# Altium footprint library Resistors_SMD_IPC-SM-782.PcbLib: 200 footprints (part 4 of 13)
Each footprint in its own frame and in the unit in brackets; x right, y up, seen from the top. Pads: shape width x height; smd on the part's side, far side on the other; paste and mask are expansions set on the pad; w line width, h text height; cw(c..) or ccw(c..) is an arc to the next point about the centre after c.
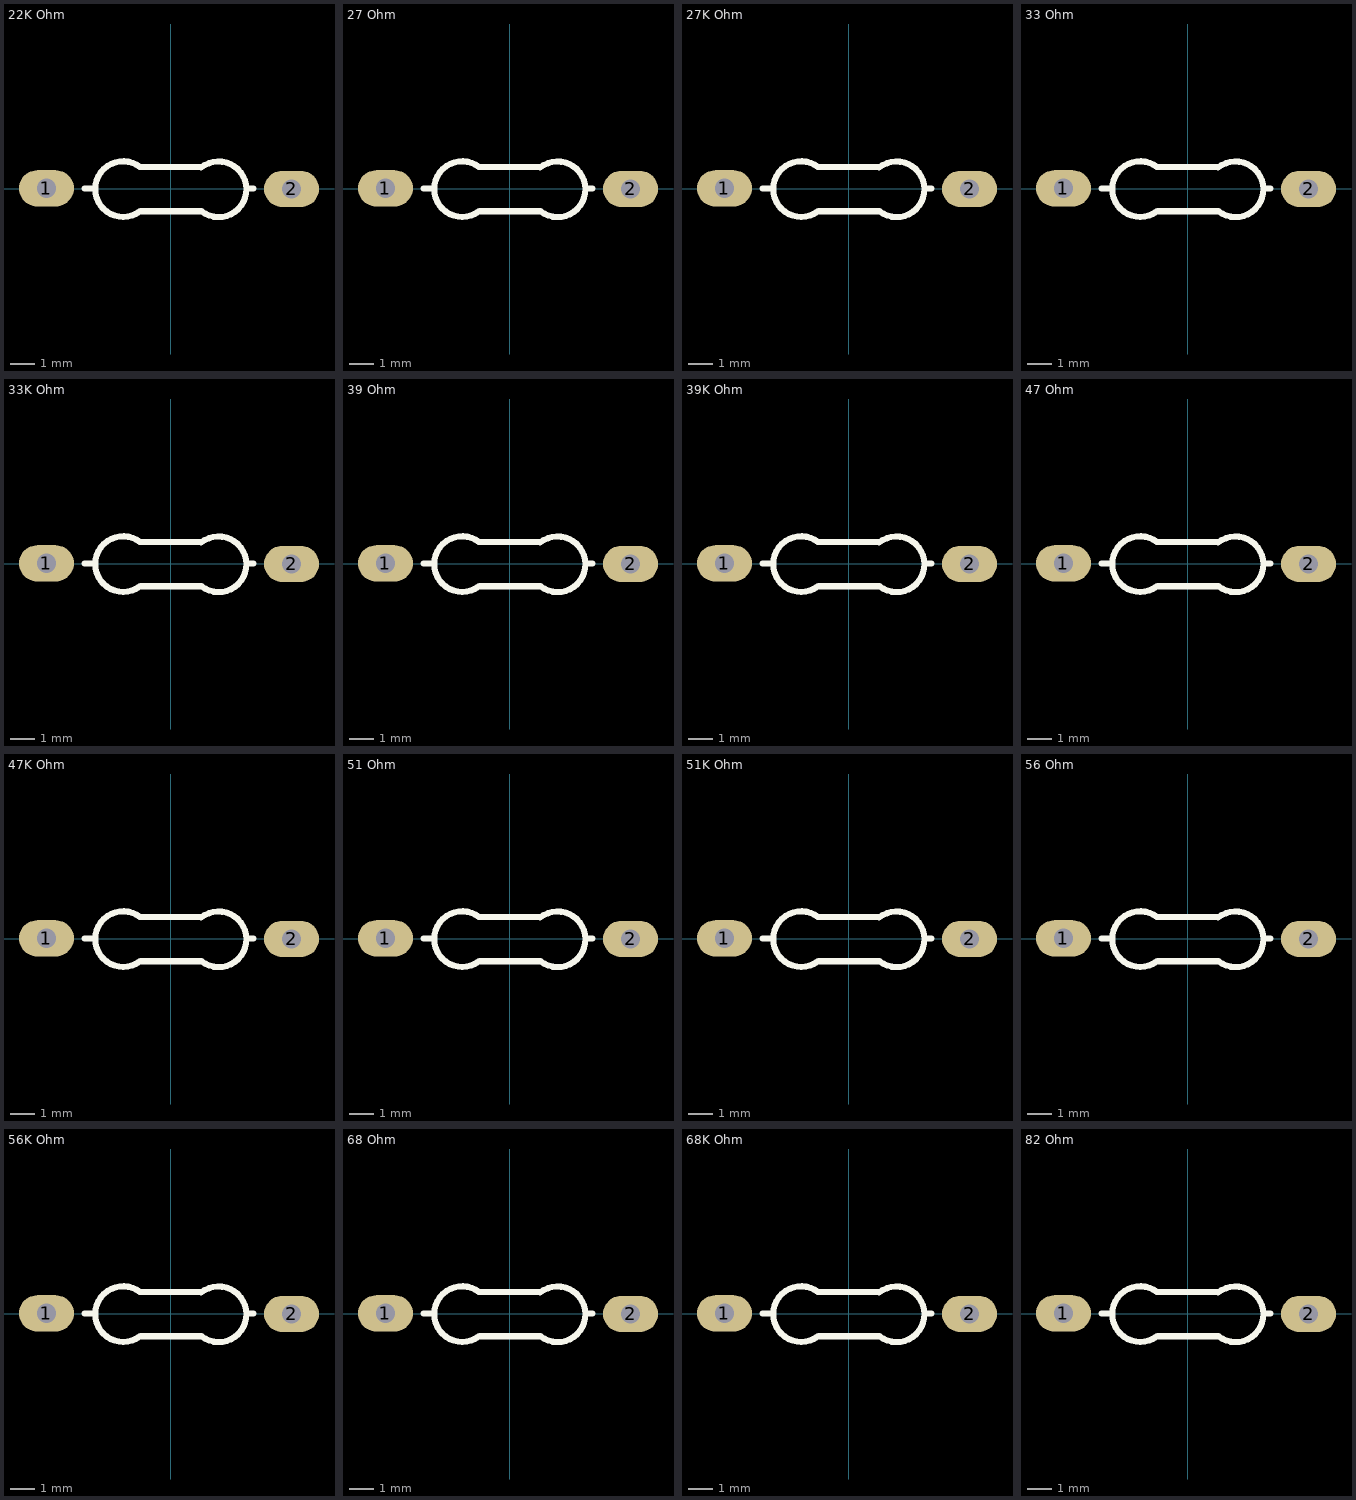
[diagram p3: the footprints below, top view; thin cyan lines are the x and y axes]

## 22K Ohm [mm] "RESISTENCIA DE 1/4 W DE 22K OHM"
pads (2):
  oval 2.27x1.5 hole 0.8: 1(-5.125,0.025) 2(5,0)
Top Overlay:
  lines w0.254: -3.55,0.025 -3.225,0.025 ; -1.269,-0.925 cw(c-1.959,-0.005) -1.25,0.9 ; -1.248,0.9 1.25,0.9 ; -1.245,-0.925 1.286,-0.925 ; 1.265,0.881 cw(c1.985,-0.015) 1.286,-0.928 ; 3.15,0.025 3.425,0.025
3D body "Res 22K.STEP": height 2.93, standoff -0.91, extent -5.385,-1.168 5.385,1.143
3D body "SW3dPS-RESISTOR, 0.25 W, 0.4 IN LEAD PITCH.STEP": height 1.16, standoff -1.16, extent -5.56,-2.349 5.21,3.125

## 27 Ohm [mm] "RESISTENCIA DE 1/4 W DE 27 OHM"
pads (2):
  oval 2.27x1.5 hole 0.8: 1(-5.125,0.025) 2(5,0)
Top Overlay:
  lines w0.254: -3.55,0.025 -3.225,0.025 ; -1.269,-0.925 cw(c-1.959,-0.005) -1.25,0.9 ; -1.248,0.9 1.25,0.9 ; -1.245,-0.925 1.286,-0.925 ; 1.265,0.881 cw(c1.985,-0.015) 1.286,-0.928 ; 3.15,0.025 3.425,0.025
3D body "Res 27.STEP": height 2.93, standoff -0.91, extent -5.385,-1.168 5.385,1.143
3D body "SW3dPS-RESISTOR, 0.25 W, 0.4 IN LEAD PITCH.STEP": height 1.16, standoff -1.16, extent -5.56,-2.349 5.21,3.125

## 27K Ohm [mm] "RESISTENCIA DE 1/4 W DE 27K OHM"
pads (2):
  oval 2.27x1.5 hole 0.8: 1(-5.125,0.025) 2(5,0)
Top Overlay:
  lines w0.254: -3.55,0.025 -3.225,0.025 ; -1.269,-0.925 cw(c-1.959,-0.005) -1.25,0.9 ; -1.248,0.9 1.25,0.9 ; -1.245,-0.925 1.286,-0.925 ; 1.265,0.881 cw(c1.985,-0.015) 1.286,-0.928 ; 3.15,0.025 3.425,0.025
3D body "Res 27K.STEP": height 2.93, standoff -0.91, extent -5.385,-1.168 5.385,1.143
3D body "SW3dPS-RESISTOR, 0.25 W, 0.4 IN LEAD PITCH.STEP": height 1.16, standoff -1.16, extent -5.56,-2.349 5.21,3.125

## 33 Ohm [mm] "RESISTENCIA DE 1/4 W DE 33 OHM"
pads (2):
  oval 2.27x1.5 hole 0.8: 1(-5.125,0.025) 2(5,0)
Top Overlay:
  lines w0.254: -3.55,0.025 -3.225,0.025 ; -1.269,-0.925 cw(c-1.959,-0.005) -1.25,0.9 ; -1.248,0.9 1.25,0.9 ; -1.245,-0.925 1.286,-0.925 ; 1.265,0.881 cw(c1.985,-0.015) 1.286,-0.928 ; 3.15,0.025 3.425,0.025
3D body "SW3dPS-RESISTOR, 0.25 W, 0.4 IN LEAD PITCH.STEP": height 1.16, standoff -1.16, extent -5.56,-2.349 5.21,3.125
3D body "Res 33.STEP": height 2.93, standoff -0.91, extent -5.385,-1.168 5.385,1.143

## 33K Ohm [mm] "RESISTENCIA DE 1/4 W DE 33K OHM"
pads (2):
  oval 2.27x1.5 hole 0.8: 1(-5.125,0.025) 2(5,0)
Top Overlay:
  lines w0.254: -3.55,0.025 -3.225,0.025 ; -1.269,-0.925 cw(c-1.959,-0.005) -1.25,0.9 ; -1.248,0.9 1.25,0.9 ; -1.245,-0.925 1.286,-0.925 ; 1.265,0.881 cw(c1.985,-0.015) 1.286,-0.928 ; 3.15,0.025 3.425,0.025
3D body "Res 33K.STEP": height 2.93, standoff -0.91, extent -5.385,-1.168 5.385,1.143
3D body "SW3dPS-RESISTOR, 0.25 W, 0.4 IN LEAD PITCH.STEP": height 1.16, standoff -1.16, extent -5.56,-2.349 5.21,3.125

## 39 Ohm [mm] "RESISTENCIA DE 1/4 W DE 39 OHM"
pads (2):
  oval 2.27x1.5 hole 0.8: 1(-5.125,0.025) 2(5,0)
Top Overlay:
  lines w0.254: -3.55,0.025 -3.225,0.025 ; -1.269,-0.925 cw(c-1.959,-0.005) -1.25,0.9 ; -1.248,0.9 1.25,0.9 ; -1.245,-0.925 1.286,-0.925 ; 1.265,0.881 cw(c1.985,-0.015) 1.286,-0.928 ; 3.15,0.025 3.425,0.025
3D body "Res 39.STEP": height 2.93, standoff -0.91, extent -5.385,-1.168 5.385,1.143
3D body "SW3dPS-RESISTOR, 0.25 W, 0.4 IN LEAD PITCH.STEP": height 1.16, standoff -1.16, extent -5.56,-2.349 5.21,3.125

## 39K Ohm [mm] "RESISTENCIA DE 1/4 W DE 39K OHM"
pads (2):
  oval 2.27x1.5 hole 0.8: 1(-5.125,0.025) 2(5,0)
Top Overlay:
  lines w0.254: -3.55,0.025 -3.225,0.025 ; -1.269,-0.925 cw(c-1.959,-0.005) -1.25,0.9 ; -1.248,0.9 1.25,0.9 ; -1.245,-0.925 1.286,-0.925 ; 1.265,0.881 cw(c1.985,-0.015) 1.286,-0.928 ; 3.15,0.025 3.425,0.025
3D body "Res 39K.STEP": height 2.93, standoff -0.91, extent -5.385,-1.168 5.385,1.143
3D body "SW3dPS-RESISTOR, 0.25 W, 0.4 IN LEAD PITCH.STEP": height 1.16, standoff -1.16, extent -5.56,-2.349 5.21,3.125

## 47 Ohm [mm] "RESISTENCIA DE 1/4 W DE 47 OHM"
pads (2):
  oval 2.27x1.5 hole 0.8: 1(-5.125,0.025) 2(5,0)
Top Overlay:
  lines w0.254: -3.55,0.025 -3.225,0.025 ; -1.269,-0.925 cw(c-1.959,-0.005) -1.25,0.9 ; -1.248,0.9 1.25,0.9 ; -1.245,-0.925 1.286,-0.925 ; 1.265,0.881 cw(c1.985,-0.015) 1.286,-0.928 ; 3.15,0.025 3.425,0.025
3D body "Res 47.STEP": height 2.93, standoff -0.91, extent -5.385,-1.168 5.385,1.143
3D body "SW3dPS-RESISTOR, 0.25 W, 0.4 IN LEAD PITCH.STEP": height 1.16, standoff -1.16, extent -5.56,-2.349 5.21,3.125

## 47K Ohm [mm] "RESISTENCIA DE 1/4 W DE 47K OHM"
pads (2):
  oval 2.27x1.5 hole 0.8: 1(-5.125,0.025) 2(5,0)
Top Overlay:
  lines w0.254: -3.55,0.025 -3.225,0.025 ; -1.269,-0.925 cw(c-1.959,-0.005) -1.25,0.9 ; -1.248,0.9 1.25,0.9 ; -1.245,-0.925 1.286,-0.925 ; 1.265,0.881 cw(c1.985,-0.015) 1.286,-0.928 ; 3.15,0.025 3.425,0.025
3D body "Res 47K.STEP": height 2.93, standoff -0.91, extent -5.385,-1.168 5.385,1.143
3D body "SW3dPS-RESISTOR, 0.25 W, 0.4 IN LEAD PITCH.STEP": height 1.16, standoff -1.16, extent -5.56,-2.349 5.21,3.125

## 51 Ohm [mm] "RESISTENCIA DE 1/4 W DE 51 OHM"
pads (2):
  oval 2.27x1.5 hole 0.8: 1(-5.125,0.025) 2(5,0)
Top Overlay:
  lines w0.254: -3.55,0.025 -3.225,0.025 ; -1.269,-0.925 cw(c-1.959,-0.005) -1.25,0.9 ; -1.248,0.9 1.25,0.9 ; -1.245,-0.925 1.286,-0.925 ; 1.265,0.881 cw(c1.985,-0.015) 1.286,-0.928 ; 3.15,0.025 3.425,0.025
3D body "Res 51.STEP": height 2.93, standoff -0.91, extent -5.385,-1.168 5.385,1.143
3D body "SW3dPS-RESISTOR, 0.25 W, 0.4 IN LEAD PITCH.STEP": height 1.16, standoff -1.16, extent -5.56,-2.349 5.21,3.125

## 51K Ohm [mm] "RESISTENCIA DE 1/4 W DE 51K OHM"
pads (2):
  oval 2.27x1.5 hole 0.8: 1(-5.125,0.025) 2(5,0)
Top Overlay:
  lines w0.254: -3.55,0.025 -3.225,0.025 ; -1.269,-0.925 cw(c-1.959,-0.005) -1.25,0.9 ; -1.248,0.9 1.25,0.9 ; -1.245,-0.925 1.286,-0.925 ; 1.265,0.881 cw(c1.985,-0.015) 1.286,-0.928 ; 3.15,0.025 3.425,0.025
3D body "Res 51K.STEP": height 2.93, standoff -0.91, extent -5.385,-1.168 5.385,1.143
3D body "SW3dPS-RESISTOR, 0.25 W, 0.4 IN LEAD PITCH.STEP": height 1.16, standoff -1.16, extent -5.56,-2.349 5.21,3.125

## 56 Ohm [mm] "RESISTENCIA DE 1/4 W DE 56 OHM"
pads (2):
  oval 2.27x1.5 hole 0.8: 1(-5.125,0.025) 2(5,0)
Top Overlay:
  lines w0.254: -3.55,0.025 -3.225,0.025 ; -1.269,-0.925 cw(c-1.959,-0.005) -1.25,0.9 ; -1.248,0.9 1.25,0.9 ; -1.245,-0.925 1.286,-0.925 ; 1.265,0.881 cw(c1.985,-0.015) 1.286,-0.928 ; 3.15,0.025 3.425,0.025
3D body "SW3dPS-RESISTOR, 0.25 W, 0.4 IN LEAD PITCH.STEP": height 1.16, standoff -1.16, extent -5.56,-2.349 5.21,3.125
3D body "Res 56.STEP": height 2.93, standoff -0.91, extent -5.385,-1.168 5.385,1.143

## 56K Ohm [mm] "RESISTENCIA DE 1/4 W DE 56K OHM"
pads (2):
  oval 2.27x1.5 hole 0.8: 1(-5.125,0.025) 2(5,0)
Top Overlay:
  lines w0.254: -3.55,0.025 -3.225,0.025 ; -1.269,-0.925 cw(c-1.959,-0.005) -1.25,0.9 ; -1.248,0.9 1.25,0.9 ; -1.245,-0.925 1.286,-0.925 ; 1.265,0.881 cw(c1.985,-0.015) 1.286,-0.928 ; 3.15,0.025 3.425,0.025
3D body "SW3dPS-RESISTOR, 0.25 W, 0.4 IN LEAD PITCH.STEP": height 1.16, standoff -1.16, extent -5.56,-2.349 5.21,3.125
3D body "Res 56K.STEP": height 2.93, standoff -0.91, extent -5.385,-1.168 5.385,1.143

## 68 Ohm [mm] "RESISTENCIA DE 1/4 W DE 68 OHM"
pads (2):
  oval 2.27x1.5 hole 0.8: 1(-5.125,0.025) 2(5,0)
Top Overlay:
  lines w0.254: -3.55,0.025 -3.225,0.025 ; -1.269,-0.925 cw(c-1.959,-0.005) -1.25,0.9 ; -1.248,0.9 1.25,0.9 ; -1.245,-0.925 1.286,-0.925 ; 1.265,0.881 cw(c1.985,-0.015) 1.286,-0.928 ; 3.15,0.025 3.425,0.025
3D body "Res 68.STEP": height 2.93, standoff -0.91, extent -5.385,-1.168 5.385,1.143
3D body "SW3dPS-RESISTOR, 0.25 W, 0.4 IN LEAD PITCH.STEP": height 1.16, standoff -1.16, extent -5.56,-2.349 5.21,3.125

## 68K Ohm [mm] "RESISTENCIA DE 1/4 W DE 68K OHM"
pads (2):
  oval 2.27x1.5 hole 0.8: 1(-5.125,0.025) 2(5,0)
Top Overlay:
  lines w0.254: -3.55,0.025 -3.225,0.025 ; -1.269,-0.925 cw(c-1.959,-0.005) -1.25,0.9 ; -1.248,0.9 1.25,0.9 ; -1.245,-0.925 1.286,-0.925 ; 1.265,0.881 cw(c1.985,-0.015) 1.286,-0.928 ; 3.15,0.025 3.425,0.025
3D body "Res 68K.STEP": height 2.93, standoff -0.91, extent -5.385,-1.168 5.385,1.143
3D body "SW3dPS-RESISTOR, 0.25 W, 0.4 IN LEAD PITCH.STEP": height 1.16, standoff -1.16, extent -5.56,-2.349 5.21,3.125

## 82 Ohm [mm] "RESISTENCIA DE 1/4 W DE 82 OHM"
pads (2):
  oval 2.27x1.5 hole 0.8: 1(-5.125,0.025) 2(5,0)
Top Overlay:
  lines w0.254: -3.55,0.025 -3.225,0.025 ; -1.269,-0.925 cw(c-1.959,-0.005) -1.25,0.9 ; -1.248,0.9 1.25,0.9 ; -1.245,-0.925 1.286,-0.925 ; 1.265,0.881 cw(c1.985,-0.015) 1.286,-0.928 ; 3.15,0.025 3.425,0.025
3D body "Res 82.STEP": height 2.93, standoff -0.91, extent -5.385,-1.168 5.385,1.143
3D body "SW3dPS-RESISTOR, 0.25 W, 0.4 IN LEAD PITCH.STEP": height 1.16, standoff -1.16, extent -5.56,-2.349 5.21,3.125